# Altium schematic symbol library AliPadash.SchLib: 1186 symbols (part 2 of 6) (continued)
## C100uF 10V 0.3Ω
designator C?, comment 100uF 10V 0.3Ω
MFAC: CA45-C-10V-100μF-K; JLC: C171664
footprint 6032TantalC
footprint RB.1/.2
footprint RB.1/.25
footprint RB.1/.3
pins: 1, 2
text: @DesignPCB

## C150PF
designator C?, comment 150pF
MFAC: 0603B151K500NT; JLC: C1594
footprint 0402
footprint CAP0.4
footprint 0402
footprint RAD0.
footprint 0402
footprint 0603
footprint 0603
pins: 1, 2
text: @DesignPCB

## C220NF
designator C?, comment 220nF
MFAC: CL10B224KA8NNNC; JLC: C21120
footprint 0805
footprint CAP0.4
footprint 0402
footprint RAD0.
footprint 0603
footprint 0603
pins: 1, 2

## C220PF
designator C?, comment 220pF
MFAC: CL10B221KB8NNNC; JLC: C1603
footprint 0805
footprint CAP0.4
footprint 0402
footprint RAD0.
footprint 0603
footprint 0603
pins: 1, 2
text: @DesignPCB

## C220PF 2KV
designator C?, comment 220pF 2Kv
MFAC: 1206B221K202NT; JLC: C63848
footprint 0805
footprint 1206
footprint 0402
footprint RAD0.
footprint CAP0.2A
footprint 1206
pins: 1, 2

## C470NF
designator C?, comment 470nF
MFAC: CL10B474KA8NNNC; JLC: C1623
footprint 0805
footprint CAP0.4
footprint 0402
footprint RAD0.
footprint 0603
footprint 0603
pins: 1, 2

## CA3065
designator U?
pins: 1 (in), 2 (in), 3 -VCC, 4 (in), 5 +VCC, 6 (in), 7 (in), 8 (out), 9 (out), 10 (out), 12 (out), 13 (out), 14 (out)

## CA3140
designator U?
pins: 1 COMP3, 2 -IN (in), 3 +IN (in), 4 V-, 5 COMP1, 6 OUT (out), 7 V+, 8 COMP2

## CA3140A
designator ?
pins: 1 COMP3, 2 -IN (in), 3 +IN (in), 4 V-, 5 COMP1, 6 OUT (out), 7 V+, 8 COMP2

## CA3246
designator Q?
part A pins: 1 C, 2 B (in), 3 E, 4, 5
part B pins: 6 B (in), 7 E, 8 C
part C pins: 9 B (in), 10 E, 11 C
part D pins: 12 B (in), 13 E, 14 C

## CA3260
designator U?
part A pins: 1 OUT (out), 2 -IN (in), 3 +IN (in), 4 V-, 8 V+
part B pins: 5 +IN (in), 6 -IN (in), 7 OUT (out)

## CAM_A_L
designator J?
footprint CAM_AVR_LSR
part A pins: L1, L2
part B pins: U1 +5V, U2 P, U3 N, U4 GND
part C pins: A1 +5V, A2 TX, A3 RX, A4 GND

## CAP
designator C?
JLCPCB: *; ManufacturerName: *
footprint 0805
footprint CAP0.4
footprint 0402
footprint RAD0.
pins: 1, 2
text: @DesignPCB

## cap2
designator *
footprint 1206-2
pins: 1, 2, 3, 4

## CAPVAR
designator C?
footprint TERIMER-2
pins: 1, 2

## CD4047
designator ?
pins: 1 C, 2 R, 3 R-C, 4 ~{AST}, 5 AST, 6 -TRG, 7 VSS, 8 +TRG, 9 EX-RST, 10, 11, 12 RE-TRG, 13 OSC OUT, 14 VDD

## CFPO5
designator U?
footprint VCO-2
pins: 1 VCC, 2 Vout Ref, 3 IFC, 4 GND, 5 OUT

## CHARGER
designator *
footprint LI-ION-CHARGER
pins: 1 EN, 2 VIN, 3 3V, 4 GND

## CO2-SENSOR
designator SEN?
footprint MH-z16 -board
pins: 1 +5V, 1B HD, 2 GND, 2B Analog-OUT, 3 RX(IN), 3B GND, 4 TX(OUT), 4B +5V, 5B RX(IN), 6B TX(OUT), 7B PWM

## co2-Sensor2
designator SEN?
footprint sprinyir
pins: 1 +5V, 2 GND, 3 D0, 4 A0

## co2-sprintir
designator SEN?
footprint sprinyir
pins: 1 GND, 2 NC, 3 +3V~5V, 4 GND, 5 Rx(in), 6 GND, 7 TX(out), 8 Zero N, 9 NC, 10 Zero Air

## COAXPAIR
designator ?
pins: 1, 2, 3

## COIL
designator ?
pins: 1, 3

## CON2
designator J?
pins: 1, 2

## CON2_1
designator J?
part A pins: 1, 2
part B pins: 3, 4

## CON3
designator J?
pins: 1, 2, 3

## CON3-PWR
designator ?
pins: 1, 2, 3

## CON4
designator J?
JLCPCB: *; ManufacturerName: *
pins: 1, 2, 3, 4

## CON4 HANDSET-FM
designator J?
part A pins: 1, 4
part B pins: 2, 3

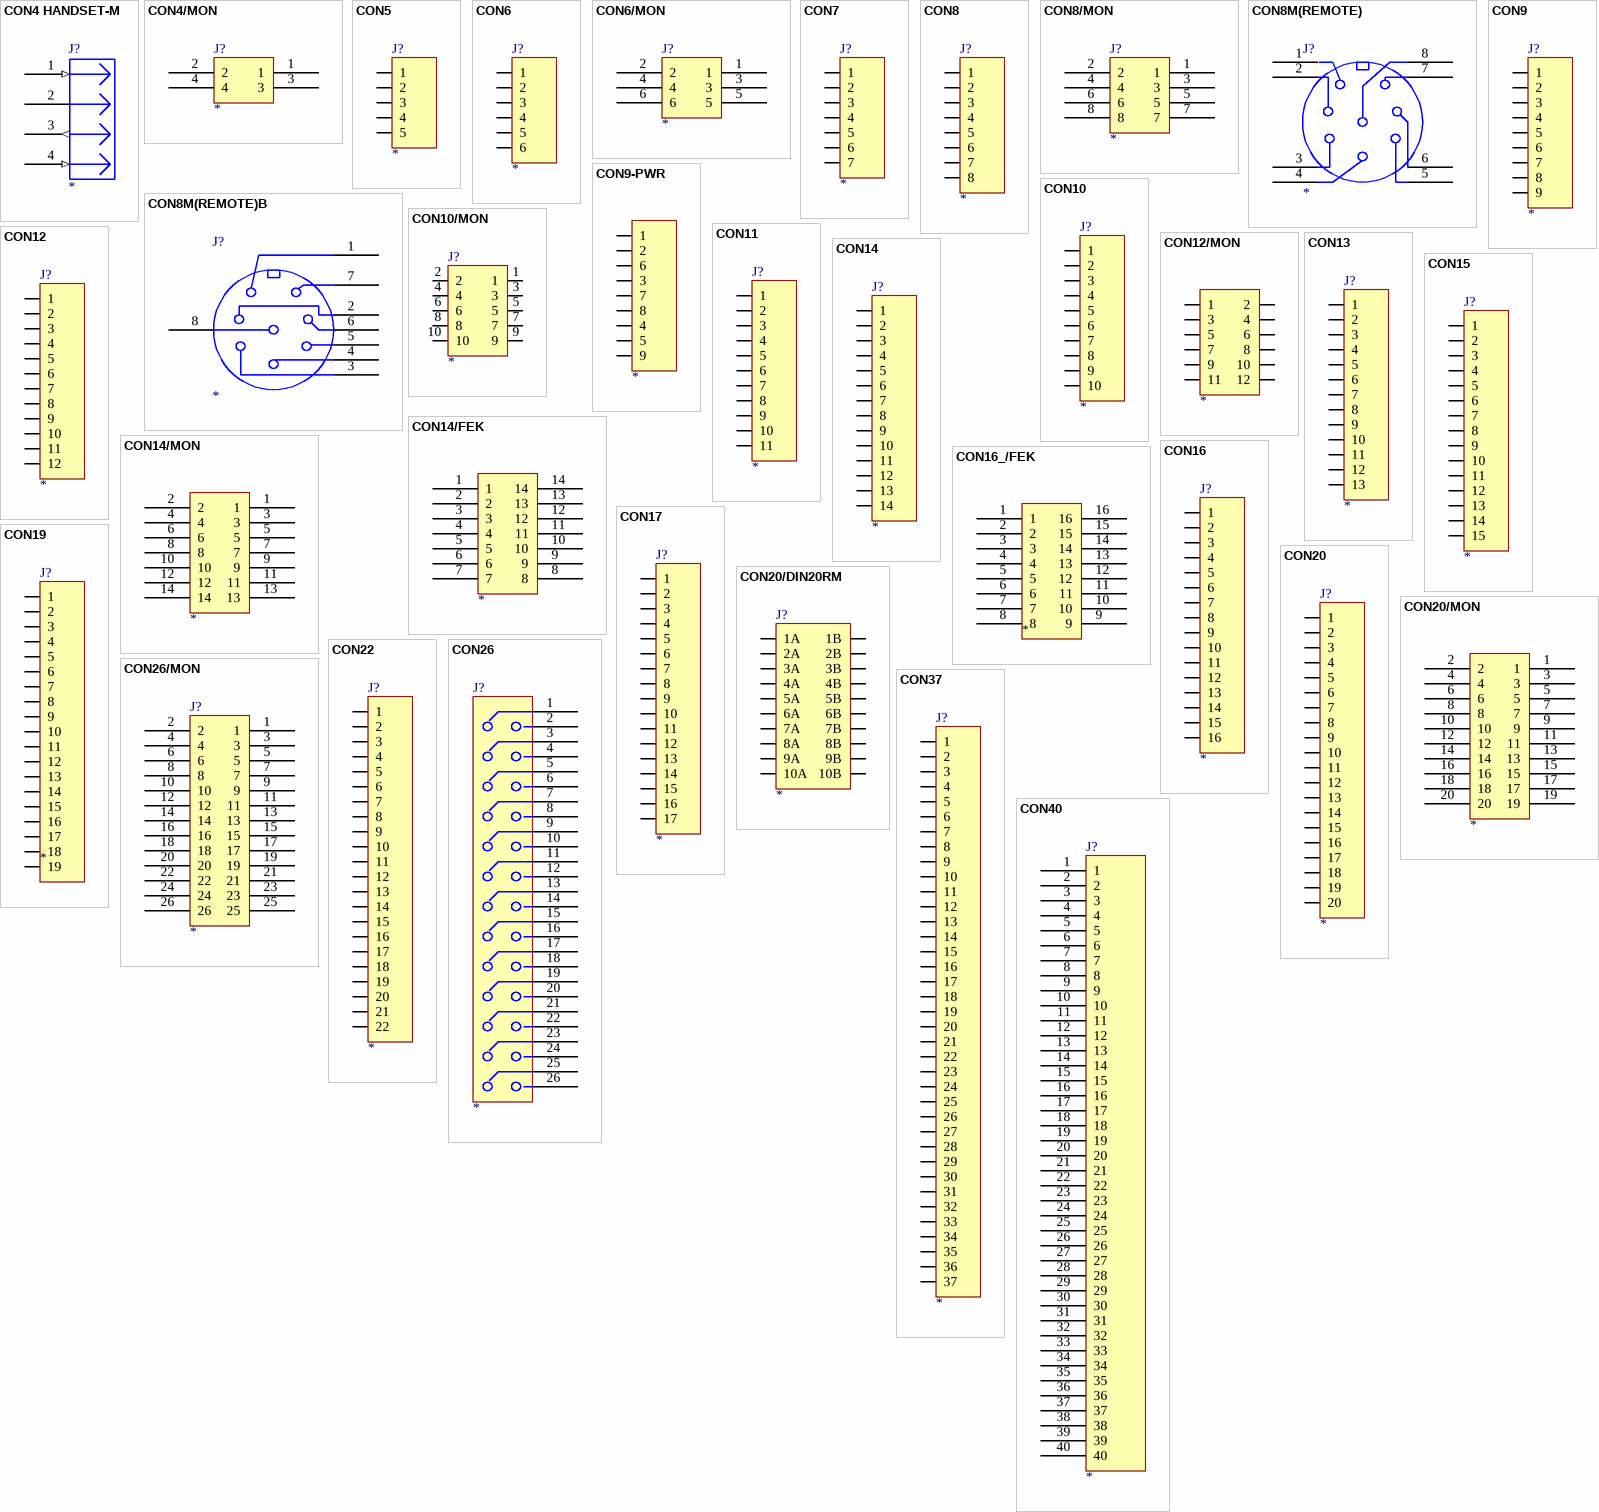
[diagram p19: symbols CON4 HANDSET-M to CON40]

## CON4 HANDSET-M
designator J?
pins: 1 SPK1 (in), 2 -MIC, 3 +MIC (out), 4 SPK2 (in)

## CON4/MON
designator J?
footprint IDC4
pins: 1, 2, 3, 4

## CON5
designator J?
pins: 1, 2, 3, 4, 5

## CON6
designator J?
JLCPCB: *; ManufacturerName: *
pins: 1, 2, 3, 4, 5, 6

## CON6/MON
designator J?
footprint IDC6
pins: 1, 2, 3, 4, 5, 6

## CON7
designator J?
pins: 1, 2, 3, 4, 5, 6, 7

## CON8
designator J?
pins: 1, 2, 3, 4, 5, 6, 7, 8

## CON8/MON
designator J?
footprint IDCF8
pins: 1, 2, 3, 4, 5, 6, 7, 8

## CON8M(REMOTE)
designator J?
footprint CON8M
pins: 1, 2, 3, 4, 5, 6, 7, 8

## CON8M(REMOTE)B
designator J?
footprint CON8M
pins: 1, 2, 3, 4, 5, 6, 7, 8

## CON9
designator J?
pins: 1, 2, 3, 4, 5, 6, 7, 8, 9

## CON9-PWR
designator ?
pins: 1, 2, 3, 4, 5, 6, 7, 8, 9

## CON10
designator J?
pins: 1, 2, 3, 4, 5, 6, 7, 8, 9, 10

## CON10/MON
designator J?
footprint IDC10
pins: 1, 2, 3, 4, 5, 6, 7, 8, 9, 10

## CON11
designator J?
pins: 1, 2, 3, 4, 5, 6, 7, 8, 9, 10, 11

## CON12
designator J?
pins: 1, 2, 3, 4, 5, 6, 7, 8, 9, 10, 11, 12

## CON12/MON
designator ?
pins: 1, 2, 3, 4, 5, 6, 7, 8, 9, 10, 11, 12

## CON13
designator J?
pins: 1, 2, 3, 4, 5, 6, 7, 8, 9, 10, 11, 12, 13

## CON14
designator J?
pins: 1, 2, 3, 4, 5, 6, 7, 8, 9, 10, 11, 12, 13, 14

## CON14/FEK
designator ?
pins: 1, 2, 3, 4, 5, 6, 7, 8, 9, 10, 11, 12, 13, 14

## CON14/MON
designator ?
pins: 1, 2, 3, 4, 5, 6, 7, 8, 9, 10, 11, 12, 13, 14

## CON15
designator J?
pins: 1, 2, 3, 4, 5, 6, 7, 8, 9, 10, 11, 12, 13, 14, 15

## CON16
designator J?
pins: 1, 2, 3, 4, 5, 6, 7, 8, 9, 10, 11, 12, 13, 14, 15, 16

## CON16_/FEK
designator ?
pins: 1, 2, 3, 4, 5, 6, 7, 8, 9, 10, 11, 12, 13, 14, 15, 16

## CON17
designator J?
pins: 1, 2, 3, 4, 5, 6, 7, 8, 9, 10, 11, 12, 13, 14, 15, 16, 17

## CON19
designator J?
pins: 1, 2, 3, 4, 5, 6, 7, 8, 9, 10, 11, 12, 13, 14, 15, 16, 17, 18, 19

## CON20
designator J?
pins: 1, 2, 3, 4, 5, 6, 7, 8, 9, 10, 11, 12, 13, 14, 15, 16, 17, 18, 19, 20

## CON20/DIN20RM
designator J?
footprint DIN20RAF
pins: 1A, 1B, 2A, 2B, 3A, 3B, 4A, 4B, 5A, 5B, 6A, 6B, 7A, 7B, 8A, 8B, 9A, 9B, 10A, 10B

## CON20/MON
designator ?
pins: 1, 2, 3, 4, 5, 6, 7, 8, 9, 10, 11, 12, 13, 14, 15, 16, 17, 18, 19, 20

## CON22
designator J?
pins: 1, 2, 3, 4, 5, 6, 7, 8, 9, 10, 11, 12, 13, 14, 15, 16, 17, 18, 19, 20, 21, 22

## CON26
designator J?
footprint IDM26
pins: 1, 2, 3, 4, 5, 6, 7, 8, 9, 10, 11, 12, 13, 14, 15, 16, 17, 18, 19, 20, 21, 22, 23, 24, 25, 26

## CON26/MON
designator J?
footprint IDCF26
pins: 1, 2, 3, 4, 5, 6, 7, 8, 9, 10, 11, 12, 13, 14, 15, 16, 17, 18, 19, 20, 21, 22, 23, 24, 25, 26

## CON37
designator J?
pins: 1, 2, 3, 4, 5, 6, 7, 8, 9, 10, 11, 12, 13, 14, 15, 16, 17, 18, 19, 20, 21, 22, 23, 24, 25, 26, 27, 28, 29, 30, 31, 32, 33, 34, 35, 36, 37

## CON40
designator J?
pins: 1, 2, 3, 4, 5, 6, 7, 8, 9, 10, 11, 12, 13, 14, 15, 16, 17, 18, 19, 20, 21, 22, 23, 24, 25, 26, 27, 28, 29, 30, 31, 32, 33, 34, 35, 36, 37, 38, 39, 40

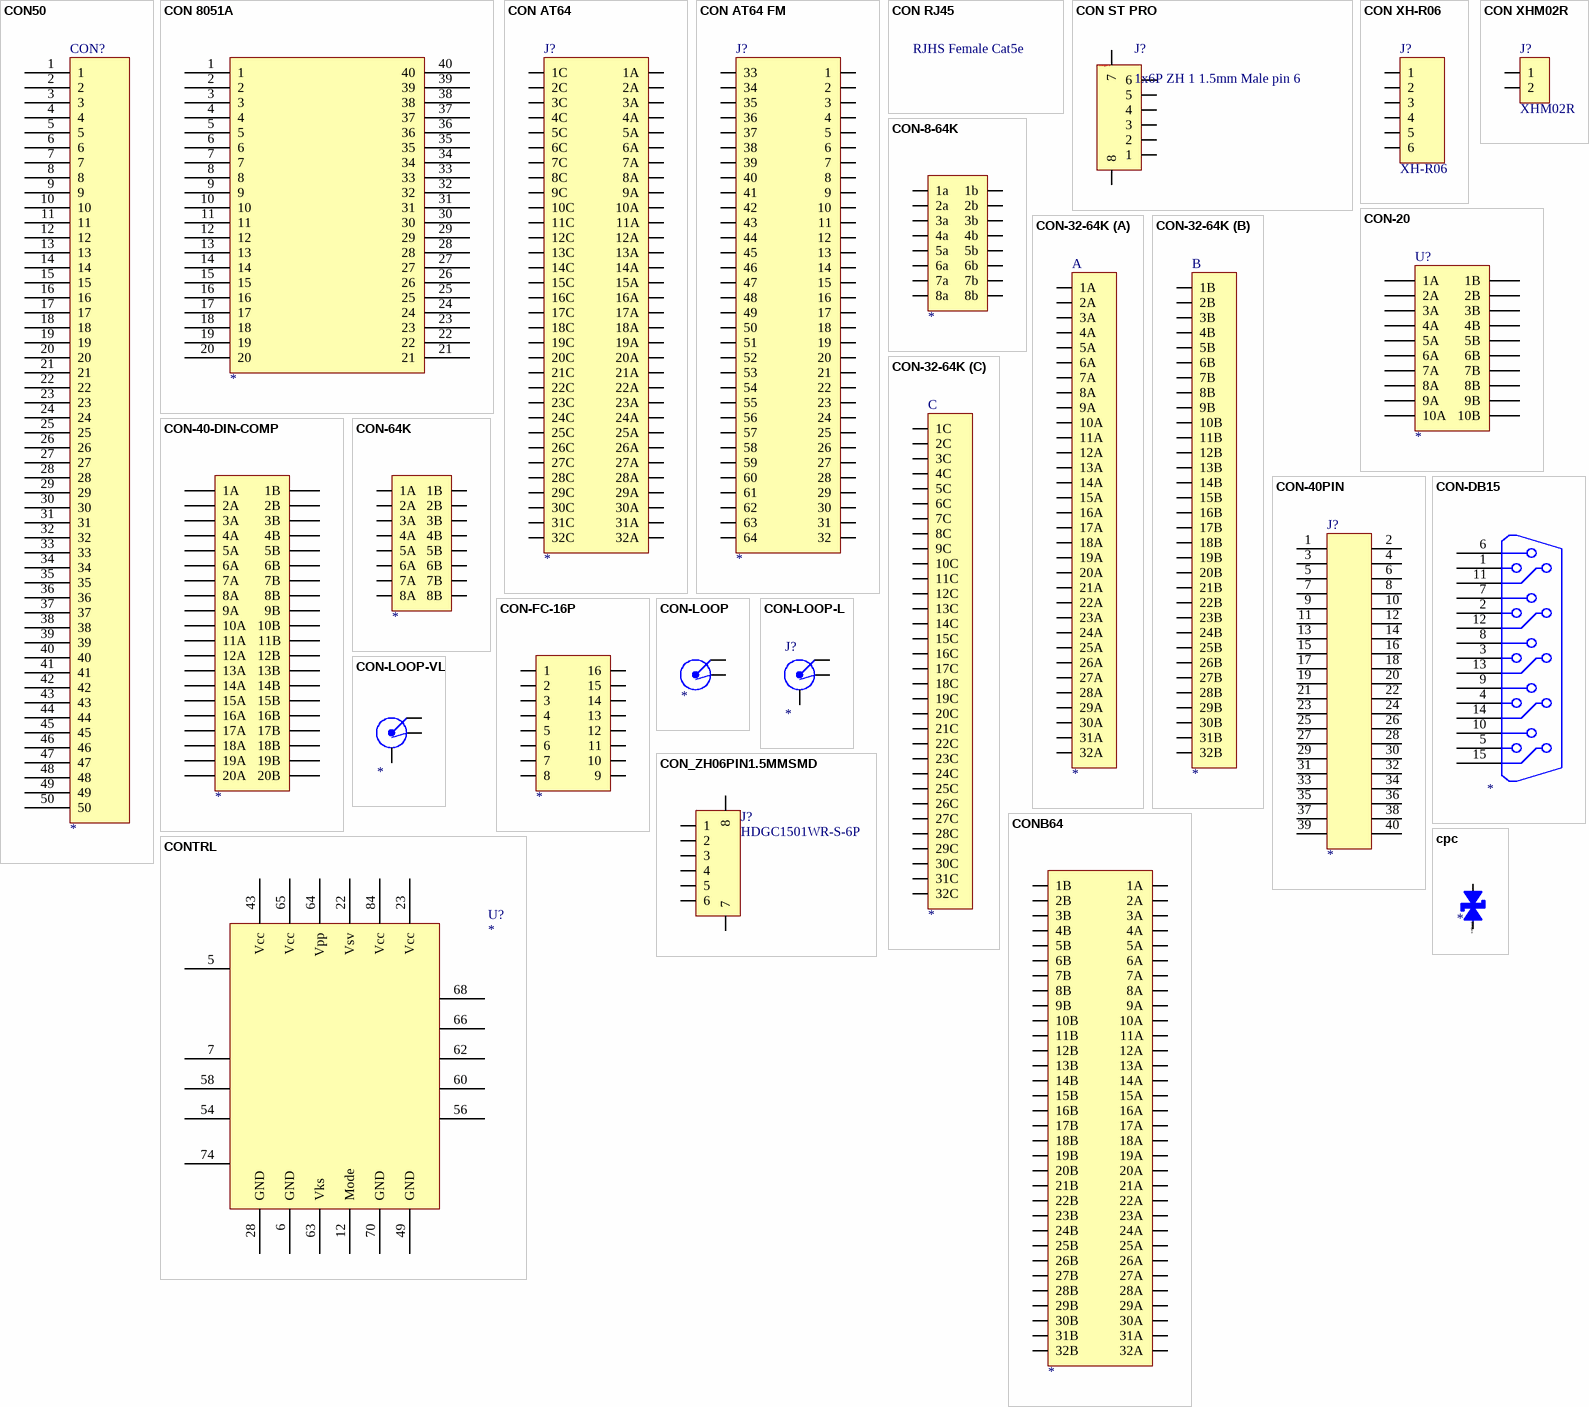
[diagram p20: symbols CON50 to cpc]

## CON50
designator CON?
Flat Cable Connector
pins: 1, 2, 3, 4, 5, 6, 7, 8, 9, 10, 11, 12, 13, 14, 15, 16, 17, 18, 19, 20, 21, 22, 23, 24, 25, 26, 27, 28, 29, 30, 31, 32, 33, 34, 35, 36, 37, 38, 39, 40, 41, 42, 43, 44, 45, 46, 47, 48, 49, 50

## CON 8051A
designator ?
pins: 1, 2, 3, 4, 5, 6, 7, 8, 9, 10, 11, 12, 13, 14, 15, 16, 17, 18, 19, 20, 21, 22, 23, 24, 25, 26, 27, 28, 29, 30, 31, 32, 33, 34, 35, 36, 37, 38, 39, 40

## CON AT64
designator J?
pins: 1A, 1C, 2A, 2C, 3A, 3C, 4A, 4C, 5A, 5C, 6A, 6C, 7A, 7C, 8A, 8C, 9A, 9C, 10A, 10C, 11A, 11C, 12A, 12C, 13A, 13C, 14A, 14C, 15A, 15C, 16A, 16C, 17A, 17C, 18A, 18C, 19A, 19C, 20A, 20C, 21A, 21C, 22A, 22C, 23A, 23C, 24A, 24C, 25A, 25C, 26A, 26C, 27A, 27C, 28A, 28C, 29A, 29C, 30A, 30C, 31A, 31C, 32A, 32C

## CON AT64 FM
designator J?
pins: 1, 2, 3, 4, 5, 6, 7, 8, 9, 10, 11, 12, 13, 14, 15, 16, 17, 18, 19, 20, 21, 22, 23, 24, 25, 26, 27, 28, 29, 30, 31, 32, 33, 34, 35, 36, 37, 38, 39, 40, 41, 42, 43, 44, 45, 46, 47, 48, 49, 50, 51, 52, 53, 54, 55, 56, 57, 58, 59, 60, 61, 62, 63, 64

## CON RJ45
designator RJHS Female Cat5e
JLC: *; MFAC: *
footprint RJ45-B-1*1
footprint MFAC (Footprint not found)

## CON ST PRO
designator J?, comment 1x6P ZH 1 1.5mm Male pin 6
MFAC: HDGC1501WR-S-6P; JLC: HDGC1501WR-S-6P
footprint ConZH6pin1.5mm
pins: 1, 2, 3, 4, 5, 6, 7, 8
text: @DesignPCB

## CON XH-R06
designator J?, comment XH-R06
JLCPCB: *; ManufacturerName: *
footprint XH-R06 (Footprint not found)
pins: 1, 2, 3, 4, 5, 6

## CON XHM02R
designator J?, comment XHM02R
JLCPCB: *; ManufacturerName: *
footprint XH-R02
pins: 1, 2

## CON-8-64K
designator ?
pins: 1 1a, 1 1b, 2 2a, 2 2b, 3 3a, 3 3b, 4 4a, 4 4b, 5 5a, 5 5b, 6 6a, 6 6b, 7 7a, 7 7b, 8 8a, 8 8b

## CON-20
designator U?
footprint DIN20RAM
footprint DIN20RAF
pins: 1A, 1B, 2A, 2B, 3A, 3B, 4A, 4B, 5A, 5B, 6A, 6B, 7A, 7B, 8A, 8B, 9A, 9B, 10A, 10B

## CON-32-64K
designator ?
part A pins: 1A, 2A, 3A, 4A, 5A, 6A, 7A, 8A, 9A, 10A, 11A, 12A, 13A, 14A, 15A, 16A, 17A, 18A, 19A, 20A, 21A, 22A, 23A, 24A, 25A, 26A, 27A, 28A, 29A, 30A, 31A, 32A
part B pins: 1B, 2B, 3B, 4B, 5B, 6B, 7B, 8B, 9B, 10B, 11B, 12B, 13B, 14B, 15B, 16B, 17B, 18B, 19B, 20B, 21B, 22B, 23B, 24B, 25B, 26B, 27B, 28B, 29B, 30B, 31B, 32B
part C pins: 1C, 2C, 3C, 4C, 5C, 6C, 7C, 8C, 9C, 10C, 11C, 12C, 13C, 14C, 15C, 16C, 17C, 18C, 19C, 20C, 21C, 22C, 23C, 24C, 25C, 26C, 27C, 28C, 29C, 30C, 31C, 32C

## CON-40-DIN-COMP
designator ?
pins: 1 1A, 1 1B, 2 2A, 2 2B, 3 3A, 3 3B, 4 4A, 4 4B, 5 5A, 5 5B, 6 6A, 6 6B, 7 7A, 7 7B, 8 8A, 8 8B, 9 9A, 9 9B, 10 10A, 10 10B, 11 11A, 11 11B, 12 12A, 12 12B, 13 13A, 13 13B, 14 14A, 14 14B, 15 15A, 15 15B, 16 16A, 16 16B, 17 17A, 17 17B, 18 18A, 18 18B, 19 19A, 19 19B, 20 20A, 20 20B

## CON-40PIN
designator J?
pins: 1, 2, 3, 4, 5, 6, 7, 8, 9, 10, 11, 12, 13, 14, 15, 16, 17, 18, 19, 20, 21, 22, 23, 24, 25, 26, 27, 28, 29, 30, 31, 32, 33, 34, 35, 36, 37, 38, 39, 40

## CON-64K
designator ?
pins: 1A, 1B, 2A, 2B, 3A, 3B, 4A, 4B, 5A, 5B, 6A, 6B, 7A, 7B, 8A, 8B

## CON-DB15
designator ?
pins: 1, 2, 3, 4, 5, 6, 7, 8, 9, 10, 11, 12, 13, 14, 15

## CON-FC-16P
designator ?
pins: 1, 2, 3, 4, 5, 6, 7, 8, 9, 10, 11, 12, 13, 14, 15, 16

## CON-LOOP
designator ?
pins: 1, 2, G GND hidden to GND

## CON-LOOP-L
designator J?
pins: 1, 2, 3

## CON-LOOP-VL
designator ?
pins: 1, 2, G

## CON_ZH06PIN1.5MMSMD
designator J?, comment HDGC1501WR-S-6P
1x6P ZH 1 1.5mm Male pin 6 -25℃~+70℃ 1A Surface Mount SMD,P=1.5mm Wire To Board / Wire To Wire Connector ROHS; JLC: C2936220; MFAC: HDGC1501WR-S-6P
footprint ConZH6pin1.5mm
pins: 1, 2, 3, 4, 5, 6, 7, 8

## CONB64
designator ?
pins: 1A, 1B, 2A, 2B, 3A, 3B, 4A, 4B, 5A, 5B, 6A, 6B, 7A, 7B, 8A, 8B, 9A, 9B, 10A, 10B, 11A, 11B, 12A, 12B, 13A, 13B, 14A, 14B, 15A, 15B, 16A, 16B, 17A, 17B, 18A, 18B, 19A, 19B, 20A, 20B, 21A, 21B, 22A, 22B, 23A, 23B, 24A, 24B, 25A, 25B, 26A, 26B, 27A, 27B, 28A, 28B, 29A, 29B, 30A, 30B, 31A, 31B, 32A, 32B

## CONTRL
designator U?
pins: 5, 6 GND (power), 7, 12 Mode (power), 22 Vsv (power), 23 Vcc (power), 28 GND (power), 43 Vcc (power), 49 GND (power), 54, 56, 58, 60, 62, 63 Vks (power), 64 Vpp (power), 65 Vcc (power), 66, 68, 70 GND (power), 74, 84 Vcc (power)

## cpc
designator ?
pins: A, K
text: @DesignPCB

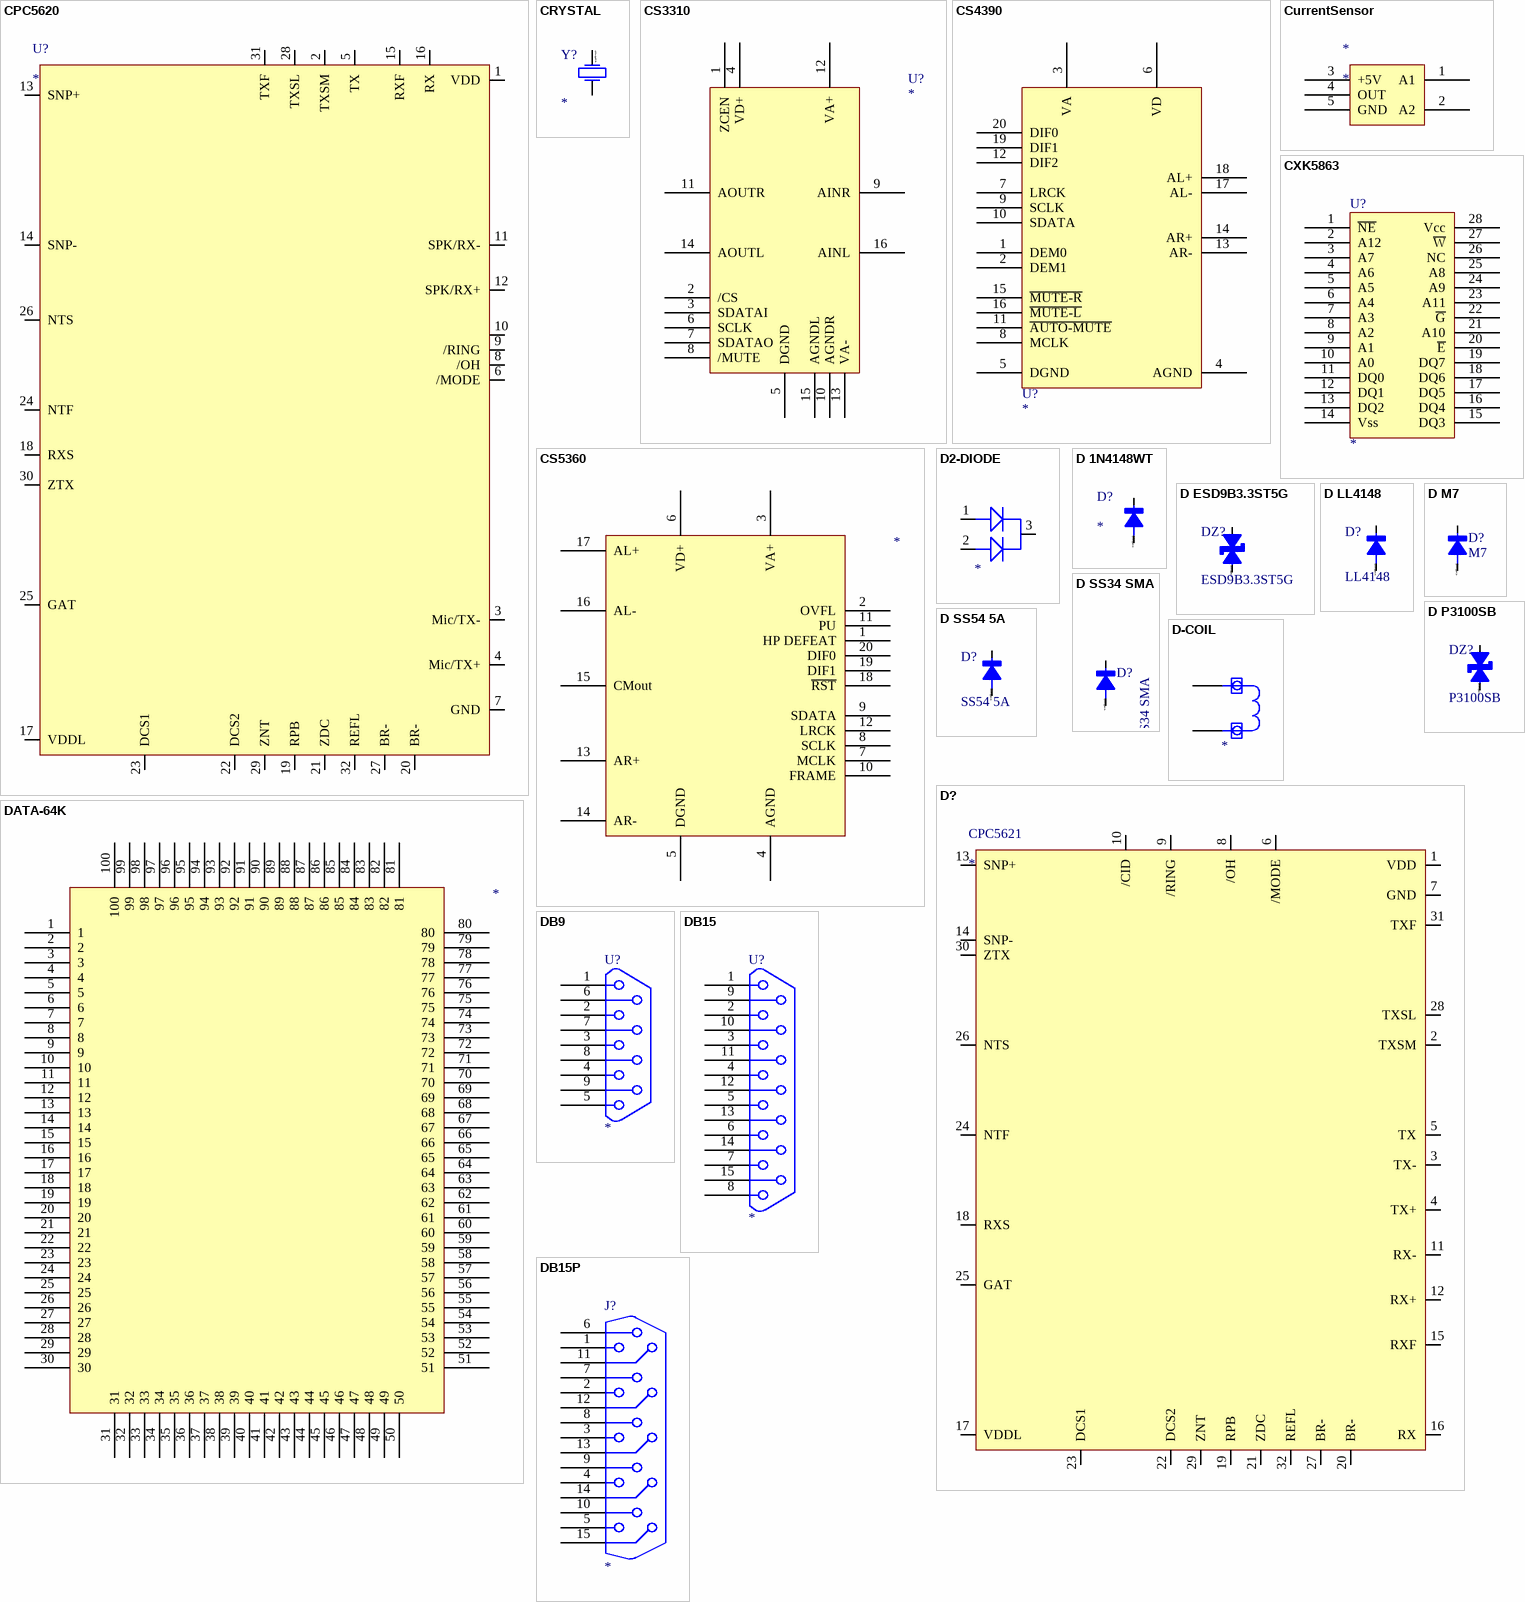
[diagram p21: symbols CPC5620 to DB15P]

## CPC5620
designator U?
pins: 1 VDD "Low-voltage (CPE) side power supply", 2 TXSM "Transmit summing junction", 3 Mic/TX- "Negative differential transmit signal to DAA / from low-voltage side"", 4 Mic/TX+ "Positive differential transmit signal to DAA from / low-voltage side"", 5 TX "Transmit differential amplifier output", 6 /MODE "When asserted low, changes gain of TX path / (-7 dB) and RX path (+7 dB) to accommodate / reactive termination networks"", 7 GND "Low-voltage (CPE) side analog ground", 8 /OH "Assert logic low for off-hook operation", 9 /RING "Ringing Detect Output", 10 /CID "Assert logic low while on hook to allow CID / information to be passed to the RX+ and RX / output pins."", 11 SPK/RX- "Negative differential analog signal received / from the telephone line. Must be AC coupled / with 0.1 F."", 12 SPK/RX+ ""Positive differential analog signal received from / the telephone line. Must be AC coupled with / 0.1 F."", 13 SNP+ "Positive differential snoop input", 14 SNP- "Negative differential snoop input", 15 RXF "Receive photodiode amplifier output", 16 RX "Receive photodiode summing junction", 17 VDDL "Power supply for line side, regulated from tip / and ring."", 18 RXS "Receive isolation amp summing junction", 19 RPB "Receive LED pre-bias current set", 20 BR- "Bridge rectifier return", 21 ZDC "Electronic inductor DCR/current limit", 22 DCS2 "DC feedback output", 23 DCS1 "V to I slope control", 24 NTF "Network amplifier feedback", 25 GAT "External MOSFET gate control", 26 NTS "Receive signal input", 27 BR- "Bridge rectifier return", 28 TXSL "Transmit photodiode summing junction", 29 ZNT "Receiver impedance set", 30 ZTX "Transmit transconductance gain set", 31 TXF "Transmit photodiode amplifier output", 32 REFL "1.25 VDC reference"

## CRYSTAL
designator Y?
footprint XTAL1
footprint XTALRA1
footprint CRYSTAL3.2*2.5
pins: 1, 2
text: @DesignPCB

## CS3310
designator U?
footprint SOL-16
pins: 1 ZCEN, 2 /CS, 3 SDATAI, 4 VD+, 5 DGND, 6 SCLK, 7 SDATAO, 8 /MUTE, 9 AINR, 10 AGNDR, 11 AOUTR, 12 VA+, 13 VA-, 14 AOUTL, 15 AGNDL, 16 AINL

## CS4390
designator U?
footprint SSOP20
pins: 1 DEM0, 2 DEM1, 3 VA, 4 AGND, 5 DGND, 6 VD, 7 LRCK, 8 MCLK, 9 SCLK, 10 SDATA, 11 ~{AUTO-MUTE}, 12 DIF2, 13 AR-, 14 AR+, 15 ~{MUTE-R}, 16 ~{MUTE-L}, 17 AL-, 18 AL+, 19 DIF1, 20 DIF0

## CS5360
designator ?
pins: 1 HP DEFEAT, 2 OVFL, 3 VA+, 4 AGND, 5 DGND, 6 VD+, 7 MCLK, 8 SCLK, 9 SDATA, 10 FRAME, 11 PU, 12 LRCK, 13 AR+, 14 AR-, 15 CMout, 16 AL-, 17 AL+, 18 ~{RST}, 19 DIF1, 20 DIF0

## CurrentSensor
designator *
footprint CurrentSensor (Footprint not found)
pins: 1 A1, 2 A2, 3 +5V, 4 OUT, 5 GND

## CXK5863
designator U?
footprint DIP28N
pins: 1 ~{NE}, 2 A12, 3 A7, 4 A6, 5 A5, 6 A4, 7 A3, 8 A2, 9 A1, 10 A0, 11 DQ0, 12 DQ1, 13 DQ2, 14 Vss, 15 DQ3, 16 DQ4, 17 DQ5, 18 DQ6, 19 DQ7, 20 ~{E}, 21 A10, 22 ~{G}, 23 A11, 24 A9, 25 A8, 26 NC, 27 ~{W}, 28 Vcc

## D2-DIODE
designator ?
pins: 1 A1, 2 C, 3 A2

## D 1N4148WT
designator D?
MFAC: 1N4148WT; JLC: C727112
footprint SO-523
pins: A, K
text: @DesignPCB

## D ESD9B3.3ST5G
designator DZ?, comment ESD9B3.3ST5G
JLC: C96512; MFAC: ESD9B3.3ST5G
footprint SOD-923_L0.8-W0.6-LS1.0-BI-1
pins: A, K
text: @DesignPCB

## D LL4148
designator D?, comment LL4148
JLC: C9808; MFAC: LL4148
footprint LL-34
footprint DIODE0.3
footprint SMD-DIODE
pins: A, K
text: @DesignPCB

## D M7
designator D?, comment M7
JLC: C95872; MFAC: M7
footprint SMA
footprint DIODE0.3
footprint SMD-DIODE
footprint SMA
pins: A, K
text: @DesignPCB

## D P3100SB
designator DZ?, comment P3100SB
JLC: C3012560; MFAC: P3100SB
footprint DIODEthyristors (Footprint not found)
pins: A, K
text: @DesignPCB

## D SS34 SMA
designator D?, comment SS34 SMA
JLC: C8678; MFAC: SS34
footprint SMA
footprint DIODE0.3
footprint SMD-DIODE
pins: A, K
text: @DesignPCB

## D SS54 5A
designator D?, comment SS54 5A
JLC: C22452; MFAC: SS54
footprint DIODE0.4
footprint DIODE0.3
footprint SMD-DIODE
footprint DIODE0.6
footprint DIODE-SMD ss32
footprint DIODE-SMD ss32
footprint SMA
pins: A, K
text: @DesignPCB

## D-COIL
designator ?
pins: 5, 6

## D?
designator CPC5621
pins: 1 VDD "Low-voltage (CPE) side power supply", 2 TXSM "Transmit summing junction", 3 TX- "Negative differential transmit signal to DAA / from low-voltage side"", 4 TX+ "Positive differential transmit signal to DAA from / low-voltage side"", 5 TX "Transmit differential amplifier output", 6 /MODE "When asserted low, changes gain of TX path / (-7 dB) and RX path (+7 dB) to accommodate / reactive termination networks"", 7 GND "Low-voltage (CPE) side analog ground", 8 /OH "Assert logic low for off-hook operation", 9 /RING "Ringing Detect Output", 10 /CID "Assert logic low while on hook to allow CID / information to be passed to the RX+ and RX / output pins."", 11 RX- "Negative differential analog signal received / from the telephone line. Must be AC coupled / with 0.1 F."", 12 RX+ ""Positive differential analog signal received from / the telephone line. Must be AC coupled with / 0.1 F."", 13 SNP+ "Positive differential snoop input", 14 SNP- "Negative differential snoop input", 15 RXF "Receive photodiode amplifier output", 16 RX "Receive photodiode summing junction", 17 VDDL "Power supply for line side, regulated from tip / and ring."", 18 RXS "Receive isolation amp summing junction", 19 RPB "Receive LED pre-bias current set", 20 BR- "Bridge rectifier return", 21 ZDC "Electronic inductor DCR/current limit", 22 DCS2 "DC feedback output", 23 DCS1 "V to I slope control", 24 NTF "Network amplifier feedback", 25 GAT "External MOSFET gate control", 26 NTS "Receive signal input", 27 BR- "Bridge rectifier return", 28 TXSL "Transmit photodiode summing junction", 29 ZNT "Receiver impedance set", 30 ZTX "Transmit transconductance gain set", 31 TXF "Transmit photodiode amplifier output", 32 REFL "1.25 VDC reference"

## DATA-64K
designator ?
pins: 1, 2, 3, 4, 5, 6, 7, 8, 9, 10, 11, 12, 13, 14, 15, 16, 17, 18, 19, 20, 21, 22, 23, 24, 25, 26, 27, 28, 29, 30, 31, 32, 33, 34, 35, 36, 37, 38, 39, 40, 41, 42, 43, 44, 45, 46, 47, 48, 49, 50, 51, 52, 53, 54, 55, 56, 57, 58, 59, 60, 61, 62, 63, 64, 65, 66, 67, 68, 69, 70, 71, 72, 73, 74, 75, 76, 77, 78, 79, 80, 81, 82, 83, 84, 85, 86, 87, 88, 89, 90, 91, 92, 93, 94, 95, 96, 97, 98, 99, 100

## DB9
designator U?
footprint DB9
pins: 1, 2, 3, 4, 5, 6, 7, 8, 9

## DB15
designator U?
footprint DB15
pins: 1, 2, 3, 4, 5, 6, 7, 8, 9, 10, 11, 12, 13, 14, 15

## DB15P
designator J?
footprint DB15PRA/F
pins: 1, 2, 3, 4, 5, 6, 7, 8, 9, 10, 11, 12, 13, 14, 15

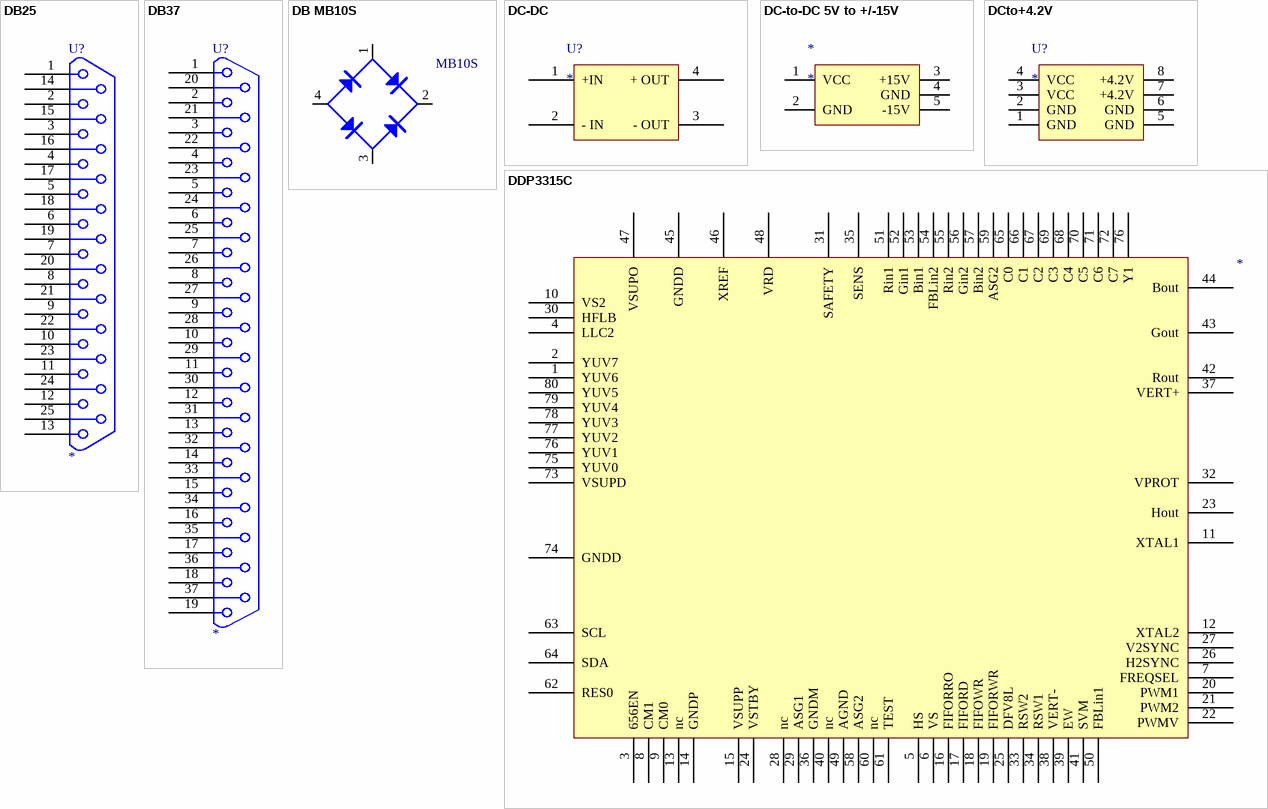
[diagram p22: symbols DB25 to DDP3315C]

## DB25
designator U?
footprint DB25
pins: 1, 2, 3, 4, 5, 6, 7, 8, 9, 10, 11, 12, 13, 14, 15, 16, 17, 18, 19, 20, 21, 22, 23, 24, 25

## DB37
designator U?
footprint DB37
pins: 1, 2, 3, 4, 5, 6, 7, 8, 9, 10, 11, 12, 13, 14, 15, 16, 17, 18, 19, 20, 21, 22, 23, 24, 25, 26, 27, 28, 29, 30, 31, 32, 33, 34, 35, 36, 37

## DB MB10S
designator ?, comment MB10S
JLC: C2488; MFAC: MB10S
footprint BRIDGE4SMD
pins: 1, 2, 3, 4

## DC-DC
designator U?
footprint CPT-1224-05
footprint LI-ION-CHARGER
pins: 1 +IN, 2 - IN, 3 - OUT, 4 + OUT

## DC-to-DC 5V to +/-15V
designator *
footprint DC-DC515
pins: 1 VCC, 2 GND, 3 +15V, 4 GND, 5 -15V

## DCto+4.2V
designator U?
pins: 1 GND, 2 GND, 3 VCC, 4 VCC, 5 GND, 6 GND, 7 +4.2V, 8 +4.2V

## DDP3315C
designator ?
U?
footprint PQFP80
pins: 1 YUV6, 2 YUV7, 3 656EN, 4 LLC2, 5 HS, 6 VS, 7 FREQSEL, 8 CM1, 9 CM0, 10 VS2, 11 XTAL1, 12 XTAL2, 13 nc, 14 GNDP, 15 VSUPP, 16 FIFORRO, 17 FIFORD, 18 FIFOWR, 19 FIFORWR, 20 PWM1, 21 PWM2, 22 PWMV, 23 Hout, 24 VSTBY, 25 DFV8L, 26 H2SYNC, 27 V2SYNC, 28 nc, 29 ASG1, 30 HFLB, 31 SAFETY, 32 VPROT, 33 RSW2, 34 RSW1, 35 SENS, 36 GNDM, 37 VERT+, 38 VERT-, 39 EW, 40 nc, 41 SVM, 42 Rout, 43 Gout, 44 Bout, 45 GNDD, 46 XREF, 47 VSUPO, 48 VRD, 49 AGND, 50 FBLin1, 51 Rin1, 52 Gin1, 53 Bin1, 54 FBLin2, 55 Rin2, 56 Gin2, 57 Bin2, 58 ASG2, 59 ASG2, 60 nc, 61 TEST, 62 RES0, 63 SCL, 64 SDA, 65 C0, 66 C1, 67 C2, 68 C4, 69 C3, 70 C5, 71 C6, 72 C7, 73 VSUPD, 74 GNDD, 75 YUV0, 76 YUV1, 76 Y1, 77 YUV2, 78 YUV3, 79 YUV4, 80 YUV5
